# Altium footprint library inductorsarebummy.PcbLib: 10 footprints
Each footprint in its own frame and in the unit in brackets; x right, y up, seen from the top. Pads: shape width x height; smd on the part's side, far side on the other; paste and mask are expansions set on the pad; w line width, h text height; cw(c..) or ccw(c..) is an arc to the next point about the centre after c.
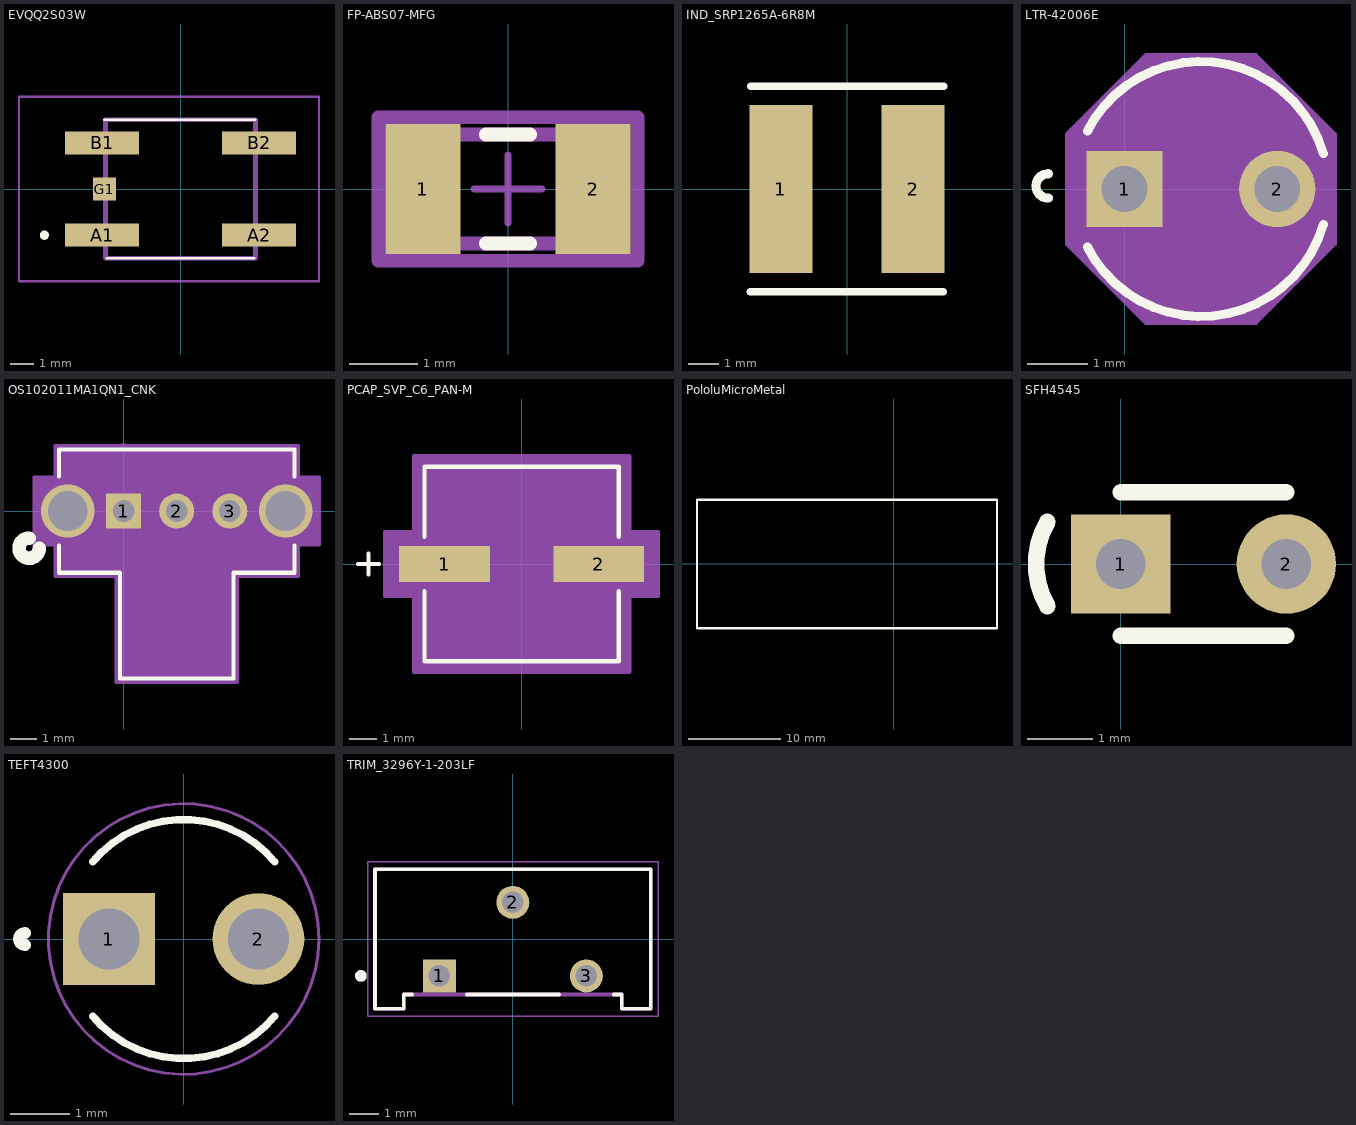
[diagram p0: the footprints below, top view; thin cyan lines are the x and y axes]

## EVQQ2S03W [mm]
pads (5):
  rect 3.2x1 smd: A1(-3.4,-2) A2(3.4,-2) B1(-3.4,2) B2(3.4,2)
  rect 1x1 smd: G1(-3.3,0)
Top Overlay:
  lines w0.1: -3.3,3 3.25,3 ; -3.2,-3 3.2,-3
  lines w0.2: -6,-2 ccw(c-5.9,-2) -5.8,-2 ccw(c-5.9,-2) -6,-2
Mechanical 15:
  lines w0.2: -3.25,-3 3.25,-3 3.25,3 -3.25,3 -3.25,-3
Bottom Assembly:
  lines w0.1: -7,-4 6,-4 6,4 -7,4 -7,-4
3D body "EVQ-Q2S03W.stp": height 3.4, standoff 0, extent -4.9,-3 4.9,3

## FP-ABS07-MFG [mm]
pads (2):
  rect 1.1x1.9 smd paste+0 mask+0: 1(-1.25,0) 2(1.25,0)
Top Overlay:
  lines w0.2: -0.325,-0.8 0.325,-0.8 ; -0.325,0.8 0.325,0.8
Top 3D Body:
  lines w0.2: -1.65,-0.8 1.65,-0.8 1.65,0.8 -1.65,0.8 -1.65,-0.8
Top Courtyard:
  lines w0.2: -1.9,-1.05 1.9,-1.05 1.9,1.05 -1.9,1.05 -1.9,-1.05
Top Assembly:
  lines w0.2: -1.9,-1.05 1.9,-1.05 1.9,1.05 -1.9,1.05 -1.9,-1.05
Top Component Center:
  lines w0.1: -0.5,0 0.5,0 ; 0,-0.5 0,0.5
3D body "Crys_Abracon_ABS07-166-32_768KHZ-T_eec.STEP": height 0.25, standoff 0, extent -1.9,-1.05 1.9,1.05

## IND_SRP1265A-6R8M [mm]
height 6.5
pads (2):
  rect 2.1x5.6 smd: 1(-2.2,0) 2(2.2,0)
Top Overlay:
  lines w0.254: -3.226,-3.429 3.2,-3.429 ; -3.2,3.429 3.226,3.429
3D body "SRP6060FA.stp": height 5.86, standoff 0, extent -3.2,-3.3 3.2,3.3

## LTR-42006E [mil]
pads (2):
  rect 50x50 / inner round 60 / far side rect 50x50 hole 30 paste-99999 mask+0: 1(0,0)
  round 50 / inner round 60 / far side round 50 hole 30 paste-99999 mask+0: 2(100,0)
Top Overlay:
  lines w6: -50,-6 cw(c-50,2) -50,10 ; -24.3,-38.1 ccw(c50,0) 130.21,-23.22 ; -24.3,38.1 cw(c50,0) 130.21,23.22
Mechanical 13:
  circle w0: c50,0 r78.5
Mechanical 15:
  region: -38.5,36.44 13.56,88.5 86.44,88.5 138.5,36.44 138.5,-36.44 86.44,-88.5 13.56,-88.5 -38.5,-36.44
  lines w1: -38.5,-36.44 -38.5,36.44 13.56,88.5 86.44,88.5 138.5,36.44 138.5,-36.44 86.44,-88.5 13.56,-88.5 -38.5,-36.44

## OS102011MA1QN1_CNK [mil]
pads (3):
  rect 52x52 hole 32 paste-99999 mask+0: 1(0,0)
  round 52 hole 32 paste-99999 mask+0: 2(78.74,0) 3(157.48,0)
via -82.68,0 diameter 79 hole 59
via 240.16,0 diameter 79 hole 59
Top Overlay:
  lines w6: -95.76,-50.95 -95.76,-91.5 -5.26,-91.5 -5.26,-248.5 162.74,-248.5 162.74,-91.5 253.24,-91.5 253.24,-50.95 ; -95.76,50.95 -95.76,91.5 253.24,91.5 253.24,50.95
  lines w20: -140,-40 ccw(c-140,-55) -125,-55
Mechanical 13:
  circle w20: c0,75 r15
  lines w1: 78.74,-86.5 78.74,-243.5 157.74,-243.5 157.74,-86.5 ; -90.76,-86.5 -90.76,86.5 248.24,86.5 248.24,-86.5 -90.76,-86.5
Mechanical 15:
  region: 167.74,-253.5 167.74,-96.5 258.24,-96.5 258.24,-49.5 289.66,-49.5 289.66,49.5 258.24,49.5 258.24,96.5 -100.76,96.5 -100.76,49.5 -132.18,49.5 -132.18,-49.5 -100.76,-49.5 -100.76,-96.5 -10.26,-96.5 -10.26,-253.5
  lines w6: -132.18,-49.5 -100.76,-49.5 -100.76,-96.5 -10.26,-96.5 -10.26,-253.5 167.74,-253.5 167.74,-96.5 258.24,-96.5 258.24,-49.5 289.66,-49.5 289.66,49.5 258.24,49.5 258.24,96.5 -100.76,96.5 -100.76,49.5 -132.18,49.5 -132.18,-49.5
3D body "OS102011MA1QN1.STEP": height 185, standoff -110, extent -94,-240 245,90

## PCAP_SVP_C6_PAN-M [mm]
pads (2):
  rect 3.291x1.313 smd paste+0 mask+0: 1(-2.801,0) 2(2.801,0)
Top Overlay:
  lines w0.152: -5.945,0 -5.183,0 ; -5.564,-0.381 -5.564,0.381 ; -3.531,-0.989 -3.531,-3.531 3.531,-3.531 3.531,-0.989 ; -3.531,0.989 -3.531,3.531 3.531,3.531 3.531,0.989
Mechanical 13:
  lines w0.025: -5.945,0 -5.183,0 ; -5.564,-0.381 -5.564,0.381 ; -3.404,-1.702 -1.702,-3.404 ; -3.404,1.702 -1.702,3.404 ; -3.404,-3.404 -3.404,3.404 3.404,3.404 3.404,-3.404 -3.404,-3.404
Mechanical 15:
  region: -3.912,-1.164 -4.955,-1.164 -4.955,1.164 -3.912,1.164 -3.912,3.912 3.912,3.912 3.912,1.164 4.955,1.164 4.955,-1.164 3.912,-1.164 3.912,-3.912 -3.912,-3.912
  lines w0.152: -4.955,-1.164 -3.912,-1.164 -3.912,-3.912 3.912,-3.912 3.912,-1.164 4.955,-1.164 4.955,1.164 3.912,1.164 3.912,3.912 -3.912,3.912 -3.912,1.164 -4.955,1.164 -4.955,-1.164
3D body "PCAP_SVP_C6_PAN.step": height 6.05, standoff 0, extent -3.746,-3.404 3.746,3.404

## PololuMicroMetal [mm]
Top Overlay:
  lines w0.254: -21.305,-6.96 11.195,-6.96 11.195,6.934 -21.305,6.934 -21.305,-6.96
3D body "mmgm-cb-enc-back-con.step": height 13.08, standoff -0.02, extent -21.184,-6.793 20.816,6.807
3D body "micro-metal-gearmotor-bracket.step": height 11.7, standoff 0, extent -0.77,-13.25 10.73,13.25

## SFH4545 [mil]
pads (2):
  rect 60x60 hole 30: 1(0,0)
  round 60 hole 30: 2(100,0)
Top Overlay:
  lines w10: -44.32,-25.59 cw(c0,0) -44.32,25.59 ; 0,-43.31 100,-43.31 ; 0,43.31 100,43.31
3D body "SFH 4545_curved_short.STEP": height 304.92, standoff 3.94, extent -57.44,-9 148.82,681.94

## TEFT4300 [mm]
height 6.1
pads (2):
  rect 1.56x1.56 / inner round 1.56 / far side rect 1.56x1.56 hole 1.04: 1(-1.27,0)
  round 1.56 hole 1.04: 2(1.27,0)
Top Overlay:
  lines w0.127: -1.55,-1.31 ccw(c0,-0.009) 1.55,-1.31 ; -1.55,1.31 cw(c0,0.009) 1.55,1.31
  lines w0.2: -2.7,-0.1 cw(c-2.7,0) -2.7,0.1
Mechanical 15:
  circle w0.05: c0,0 r2.3
3D body "TEFT4300_curved_short.STEP": height 6.94, standoff 0.1, extent -1.626,-0.203 1.574,13.797

## TRIM_3296Y-1-203LF [mm]
height 11.8
pads (3):
  rect 1.14x1.14 / inner round 1.14 / far side rect 1.14x1.14 hole 0.74: 1(-2.54,-1.27)
  round 1.14 hole 0.74: 2(0,1.27) 3(2.54,-1.27)
Top Overlay:
  circle w0.2: c-5.25,-1.27 r0.1
  lines w0.127: -3.484,-1.91 -3.765,-1.91 -3.765,-2.41 -4.765,-2.41 -4.765,2.42 4.765,2.42 4.765,-2.41 3.765,-2.41 3.765,-1.91 3.484,-1.91 ; -1.596,-1.91 1.596,-1.91
Mechanical 13:
  circle w0.2: c-5.25,-1.27 r0.1
  lines w0.127: -4.765,-2.41 -3.765,-2.41 -3.765,-1.91 3.765,-1.91 3.765,-2.41 4.765,-2.41 4.765,2.42 -4.765,2.42 -4.765,-2.41
Mechanical 15:
  lines w0.05: -5.015,-2.66 -5.015,2.67 5.015,2.67 5.015,-2.66 -5.015,-2.66
3D body "step_temp.STEP": height 11.55, standoff -7.72, extent -4.765,-2.415 4.765,2.415